# Altium footprint library ICs And Semiconductors THD.PcbLib: 350 footprints (part 14 of 22) (continued)
## LED_MENTOR_RTZ.2081G [mm] "8x Diametre 2mm Green LED Horizontal LED Array" (continued)
  text "C" at -3.279,8.455 h1
  text "A" at 2.763,8.452 h1
  text "1" at -4.227,8.455 h1
  text "2" at -4.227,5.915 h1
  text "3" at -4.227,3.375 h1
  text "4" at -4.227,0.835 h1
  text "5" at -4.227,-1.705 h1
  text "6" at -4.227,-4.245 h1
  text "7" at -4.227,-6.785 h1
  text "8" at -4.227,-9.325 h1
3D body "LED_MENTOR_RTZ.2081G.stp": height 5.08, standoff -3.3, extent -7.37,-10.16 1.93,10.16

## LED_VISHAY_TSAL6200 [mm] "5mm Infrared Emitting Diode, VISHAY TSAL"
height 13.7
pads (2):
  rect 1.3x1.3 hole 0.8: 1(-1.27,0)
  round 1.3 hole 0.8: 2(1.27,0)
Top Overlay:
  lines w0.2: -0.3,-0.6 -0.3,0.6 ; -2.5,-1.47 ccw(c0,0) -2.5,1.47 -2.5,-1.47 ; -0.3,0 0.3,-0.6 0.3,0.6 -0.3,0
Notvisible:
  lines w0.1: -1.27,1 -1.27,0 -0.27,0 ; 0,1 0,0 1,0 ; 1.27,1 1.27,0 2.27,0 ; -1.52,-0.25 -1.52,0.25 -1.02,0.25 -1.02,-0.25 -1.52,-0.25 ; 1.02,-0.25 1.02,0.25 1.52,0.25 1.52,-0.25 1.02,-0.25
  text "C" at -1.651,1 h1
  text "A" at 0.913,1 h1
Mechanical 14:
  circle w0.1: c0,0 r2.5
  lines w0.1: -0.3,-0.6 -0.3,0.6 ; -2.5,-1.47 ccw(c0,0) -2.5,1.47 -2.5,-1.47 ; -0.3,0 0.3,0.6 0.3,-0.6 -0.3,0
3D body "LED_VISHAY_TSAL6200.stp": height 13.7, standoff -3.1, extent -2.5,-2.9 2.9,2.9

## MICROSEMI_D1_FLIP [mm] "MICROSEMI D1 Package Module, Body 94mm x 34mm, Screws on PCB Version"
height 31
pads (3):
  rrect10% 14x17 hole 5.5: 1(23,0) 2(0,0) 3(-23,0)
via -19.103,-2.25 diameter 1 hole 0.5
via -19.103,2.25 diameter 1 hole 0.5
via -26.897,-2.25 diameter 1 hole 0.5
via -23,4.5 diameter 1 hole 0.5
via -26.897,2.25 diameter 1 hole 0.5
via -23,-4.5 diameter 1 hole 0.5
via 3.897,-2.25 diameter 1 hole 0.5
via 3.897,2.25 diameter 1 hole 0.5
via -3.897,-2.25 diameter 1 hole 0.5
via 0,4.5 diameter 1 hole 0.5
via -3.897,2.25 diameter 1 hole 0.5
via 0,-4.5 diameter 1 hole 0.5
via 23,-4.5 diameter 1 hole 0.5
via 19.103,2.25 diameter 1 hole 0.5
via 23,4.5 diameter 1 hole 0.5
via 19.103,-2.25 diameter 1 hole 0.5
via 26.897,2.25 diameter 1 hole 0.5
via 26.897,-2.25 diameter 1 hole 0.5
Top Overlay:
  lines w0.2: -32.8,-16.906 32.8,-16.906 ; -32.8,16.894 32.8,16.894 ; -32,-11.494 -32,-12.506 -30.5,-12.506 ; -32,-10.494 -32,-9.494 ; -32,-8.494 -32,-7.494 ; -32,-6.494 -32,-5.494 ; -32,-4.494 -32,-3.494 ; -32,-2.494 -32,-1.494 ; -32,-0.494 -32,0.506 ; -32,1.506 -32,2.506 ; -32,3.506 -32,4.506 ; -32,5.506 -32,6.506 ; -32,7.506 -32,8.506 ; -32,9.506 -32,10.506 ; -32,11.506 -32,12.494 -30.5,12.494 ; -29.5,-12.506 -28.5,-12.506 ; -29.5,12.494 -28.5,12.494 ; -27.5,-12.506 -26.5,-12.506 ; -27.5,12.494 -26.5,12.494 ; -25.5,-12.506 -24.5,-12.506 ; -25.5,12.494 -24.5,12.494 ; -23.5,-12.506 -22.5,-12.506 ; -23.5,12.494 -22.5,12.494 ; -21.5,-12.506 -20.5,-12.506 ; -21.5,12.494 -20.5,12.494 ; -19.5,-12.506 -18.5,-12.506 ; -19.5,12.494 -18.5,12.494 ; -17.5,-12.506 -16.5,-12.506 ; -17.5,12.494 -16.5,12.494 ; -15.5,-12.506 -14.46,-12.506 -14.46,-11.494 ; -15.5,12.494 -14.46,12.494 -14.46,11.506 ; -14.46,-10.494 -14.46,-9.494 ; -14.46,-8.494 -14.46,-7.494 ; -14.46,-6.494 -14.46,-5.494 ; -14.46,-4.494 -14.46,-3.494 ; -14.46,-2.494 -14.46,-1.494 ; -14.46,-0.494 -14.46,0.506 ; -14.46,1.506 -14.46,2.506 ; -14.46,3.506 -14.46,4.506 ; -14.46,5.506 -14.46,6.506 ; -14.46,7.506 -14.46,8.506 ; -14.46,9.506 -14.46,10.506 ; -9,-11.494 -9,-12.506 -7.5,-12.506 ; -9,-10.494 -9,-9.494 ; -9,-8.494 -9,-7.494 ; -9,-6.494 -9,-5.494 ; -9,-4.494 -9,-3.494 ; -9,-2.494 -9,-1.494 ; -9,-0.494 -9,0.506 ; -9,1.506 -9,2.506 ; -9,3.506 -9,4.506 ; -9,5.506 -9,6.506 ; -9,7.506 -9,8.506 ; -9,9.506 -9,10.506 ; -9,11.506 -9,12.494 -7.5,12.494 ; -6.5,-12.506 -5.5,-12.506 ; -6.5,12.494 -5.5,12.494 ; -4.5,-12.506 -3.5,-12.506 ; -4.5,12.494 -3.5,12.494 ; -2.5,-12.506 -1.5,-12.506 ; -2.5,12.494 -1.5,12.494 ; -0.5,-12.506 0.5,-12.506 ; -0.5,12.494 0.5,12.494 ; 1.5,-12.506 2.5,-12.506 ; 1.5,12.494 2.5,12.494 ; 3.5,-12.506 4.5,-12.506 ; 3.5,12.494 4.5,12.494 ; 5.5,-12.506 6.5,-12.506 ; 5.5,12.494 6.5,12.494 ; 7.5,-12.506 8.54,-12.506 8.54,-11.494 ; 7.5,12.494 8.54,12.494 8.54,11.506 ; 8.54,-10.494 8.54,-9.494 ; 8.54,-8.494 8.54,-7.494 ; 8.54,-6.494 8.54,-5.494 ; 8.54,-4.494 8.54,-3.494 ; 8.54,-2.494 8.54,-1.494 ; 8.54,-0.494 8.54,0.506 ; 8.54,1.506 8.54,2.506 ; 8.54,3.506 8.54,4.506 ; 8.54,5.506 8.54,6.506 ; 8.54,7.506 8.54,8.506 ; 8.54,9.506 8.54,10.506 ; 14,-11.494 14,-12.506 15.5,-12.506 ; 14,-10.494 14,-9.494 ; 14,-8.494 14,-7.494 ; 14,-6.494 14,-5.494 ; 14,-4.494 14,-3.494 ; 14,-2.494 14,-1.494 ; 14,-0.494 14,0.506 ; 14,1.506 14,2.506 ; 14,3.506 14,4.506 ; 14,5.506 14,6.506 ; 14,7.506 14,8.506 ; 14,9.506 14,10.506 ; 14,11.506 14,12.494 15.5,12.494 ; 16.5,-12.506 17.5,-12.506 ; 16.5,12.494 17.5,12.494 ; 18.5,-12.506 19.5,-12.506 ; 18.5,12.494 19.5,12.494 ; 20.5,-12.506 21.5,-12.506 ; 20.5,12.494 21.5,12.494 ; 22.5,-12.506 23.5,-12.506 ; 22.5,12.494 23.5,12.494 ; 24.5,-12.506 25.5,-12.506 ; 24.5,12.494 25.5,12.494 ; 26.5,-12.506 27.5,-12.506 ; 26.5,12.494 27.5,12.494 ; 28.5,-12.506 29.5,-12.506 ; 28.5,12.494 29.5,12.494 ; 30.5,-12.506 31.54,-12.506 31.54,-11.494 ; 30.5,12.494 31.54,12.494 31.54,11.506 ; 31.54,-10.494 31.54,-9.494 ; 31.54,-8.494 31.54,-7.494 ; 31.54,-6.494 31.54,-5.494 ; 31.54,-4.494 31.54,-3.494 ; 31.54,-2.494 31.54,-1.494 ; 31.54,-0.494 31.54,0.506 ; 31.54,1.506 31.54,2.506 ; 31.54,3.506 31.54,4.506 ; 31.54,5.506 31.54,6.506 ; 31.54,7.506 31.54,8.506 ; 31.54,9.506 31.54,10.506
  text "3" at -23.761,9.5 h1.5
  text "2" at -0.647,9.5 h1.5
  text "1" at 22.848,9.5 h1.5
  text "4" at -49.796,-14.541 h1.5
  text "5" at -49.796,-10.037 h1.5
  text "7" at -49.796,7.503 h1.5
  text "6" at -49.796,12.004 h1.5
  text "11" at 48.109,12.512 h1.5
  text "10" at 48.109,8.011 h1.5
  text "8" at 48.206,-10.164 h1.5
  text "9" at 48.206,-14.668 h1.5
Keep-Out Layer:
  board cut-out: -46.8,-16 -46.8,-16.098 -46.762,-16.292 -46.686,-16.474 -46.577,-16.637 -46.437,-16.777 -46.274,-16.886 -46.092,-16.962 -45.899,-17 -45.8,-17 -34.2,-17 -34.102,-17 -33.908,-16.962 -33.726,-16.886 -33.563,-16.777 -33.423,-16.637 -33.314,-16.474 -33.238,-16.292 -33.2,-16.098 -33.2,-16 -33.2,16 -33.2,16.098 -33.238,16.292 -33.314,16.474 -33.423,16.637 -33.563,16.777 -33.726,16.886 -33.908,16.962 -34.102,17 -34.2,17 -45.8,17 -45.899,17 -46.092,16.962 -46.274,16.886 -46.437,16.777 -46.577,16.637 -46.686,16.474 -46.762,16.292 -46.8,16.098 -46.8,16
  board cut-out: 33.2,-16 33.2,-16.098 33.238,-16.292 33.314,-16.474 33.423,-16.637 33.563,-16.777 33.726,-16.886 33.908,-16.962 34.102,-17 34.2,-17 45.8,-17 45.899,-17 46.092,-16.962 46.274,-16.886 46.437,-16.777 46.577,-16.637 46.686,-16.474 46.762,-16.292 46.8,-16.098 46.8,-16 46.8,16 46.8,16.098 46.762,16.292 46.686,16.474 46.577,16.637 46.437,16.777 46.274,16.886 46.092,16.962 45.899,17 45.8,17 34.2,17 34.102,17 33.908,16.962 33.726,16.886 33.563,16.777 33.423,16.637 33.314,16.474 33.238,16.292 33.2,16.098 33.2,16
Mechanical 1:
  lines w1.27: -46.8,-16 ccw(c-45.8,-16) -45.8,-17 -34.2,-17 ccw(c-34.2,-16) -33.2,-16 -33.2,16 ccw(c-34.2,16) -34.2,17 -45.8,17 ccw(c-45.8,16) -46.8,16 -46.8,-16 ; 33.2,-16 ccw(c34.2,-16) 34.2,-17 45.8,-17 ccw(c45.8,-16) 46.8,-16 46.8,16 ccw(c45.8,16) 45.8,17 34.2,17 ccw(c34.2,16) 33.2,16 33.2,-16
Notvisible:
  drawing of 321 lines, arcs and shapes, not listed
Mechanical 14:
  drawing of 262 lines, arcs and shapes, not listed
  text "3" at -23.761,9.5 h1.5
  text "2" at -0.647,9.5 h1.5
  text "1" at 22.848,9.5 h1.5
  text "4" at -49.796,-14.541 h1.5
  text "5" at -49.796,-10.037 h1.5
  text "7" at -49.796,7.503 h1.5
  text "6" at -49.796,12.004 h1.5
  text "11" at 48.109,12.512 h1.5
  text "10" at 48.109,8.011 h1.5
  text "8" at 48.206,-10.164 h1.5
  text "9" at 48.206,-14.668 h1.5
Drill Drawing:
  lines w0.1: -46.2,5.878 -46.8,6.096 ; -46.2,6.314 -46.8,6.096 ; -43.652,-16.4 -43.434,-17 ; -43.652,16.4 -43.434,17 ; -43.216,-16.4 -43.434,-17 ; -43.216,16.4 -43.434,17 ; -40.5,0 -40,0 ; -40,-0.5 -40,0 ; -40,0.5 -40,0 ; -39.5,0 -40,0 ; -39.37,-15.886 -34.152,-15.886 -33.401,-16.637 ; -34.307,-16.214 -33.401,-16.637 ; -33.824,-15.731 -33.401,-16.637 ; -33.8,5.878 -33.2,6.096 ; -33.8,6.314 -33.2,6.096 ; 33.8,5.878 33.2,6.096 ; 33.8,6.314 33.2,6.096 ; 36.348,-16.4 36.566,-17 ; 36.348,16.4 36.566,17 ; 36.784,-16.4 36.566,-17 ; 36.784,16.4 36.566,17 ; 39.5,0 40,0 ; 40,-0.5 40,0 ; 40,0.5 40,0 ; 40.5,0 40,0 ; 40.63,-15.886 45.848,-15.886 46.599,-16.637 ; 45.693,-16.214 46.599,-16.637 ; 46.176,-15.731 46.599,-16.637 ; 46.2,5.878 46.8,6.096 ; 46.2,6.314 46.8,6.096 ; -46.8,6.096 -33.2,6.096 ; -43.434,-17 -43.434,17 ; 33.2,-16 ccw(c34.2,-16) 34.2,-17 ; 33.2,-16 ccw(c34.2,-16) 34.2,-17 ; 33.2,-16 33.2,16 ; 33.2,-16 33.2,16 ; 33.2,6.096 46.8,6.096 ; 33.2,16 cw(c34.2,16) 34.2,17 ; 33.2,16 cw(c34.2,16) 34.2,17 ; 34.2,-17 45.8,-17 ; 34.2,-17 45.8,-17 ; 34.2,17 45.8,17 ; 34.2,17 45.8,17 ; 36.566,-17 36.566,17 ; 45.8,-17 ccw(c45.8,-16) 46.8,-16 ; 45.8,-17 ccw(c45.8,-16) 46.8,-16 ; 45.8,17 cw(c45.8,16) 46.8,16 ; 45.8,17 cw(c45.8,16) 46.8,16 ; 46.8,-16 46.8,16 ; 46.8,-16 46.8,16 ; -46.8,-16 ccw(c-45.8,-16) -45.8,-17 -34.2,-17 ccw(c-34.2,-16) -33.2,-16 -33.2,16 ccw(c-34.2,16) -34.2,17 -45.8,17 ccw(c-45.8,16) -46.8,16 -46.8,-16
  text "34mm" at 36.058,-0.635 h0.9
  text "13.6mm" at 40.757,6.604 h0.9
  text "r =1mm" at 40.757,-15.621 h0.9
  text "r =1mm" at -39.243,-15.621 h0.9
  text "13.6mm" at -39.243,6.604 h0.9
  text "34mm" at -43.942,-0.635 h0.9
3D body "MICROSEMI_D1_FLIP_Part1.stp": height 30.51, standoff 0, extent -47,-16.906 47,16.894
3D body "MICROSEMI_D1_FLIP_Part2.stp": height 10.4, standoff -5.27, extent -27.75,-4.75 27.75,4.75

## MICROSEMI_SOT-227_FLIP [mm] "MICROSEMI SOT-227 (ISOTOP) Case, Body 38.2mm x 25.4mm, Screws on PCB Version"
height 12.2
pads (4):
  rrect50% 9.5x9.5 hole 4.4: 1(7.5,6.35) 2(-7.5,6.35) 3(-7.5,-6.35) 4(7.5,-6.35)
via -4.75,-4.763 diameter 1 hole 0.5
via -7.5,-3.175 diameter 1 hole 0.5
via -10.25,-4.763 diameter 1 hole 0.5
via -10.25,-7.938 diameter 1 hole 0.5
via -7.5,-9.525 diameter 1 hole 0.5
via -4.75,-7.938 diameter 1 hole 0.5
via 10.25,-4.763 diameter 1 hole 0.5
via 7.5,-3.175 diameter 1 hole 0.5
via 4.75,-4.763 diameter 1 hole 0.5
via 4.75,-7.938 diameter 1 hole 0.5
via 7.5,-9.525 diameter 1 hole 0.5
via 10.25,-7.938 diameter 1 hole 0.5
via -4.75,7.938 diameter 1 hole 0.5
via -7.5,9.525 diameter 1 hole 0.5
via -10.25,7.938 diameter 1 hole 0.5
via -10.25,4.763 diameter 1 hole 0.5
via -7.5,3.175 diameter 1 hole 0.5
via -4.75,4.763 diameter 1 hole 0.5
via 10.25,7.938 diameter 1 hole 0.5
via 7.5,9.525 diameter 1 hole 0.5
via 4.75,7.938 diameter 1 hole 0.5
via 4.75,4.763 diameter 1 hole 0.5
via 7.5,3.175 diameter 1 hole 0.5
via 10.25,4.763 diameter 1 hole 0.5
Top Overlay:
  circle w0.2: c-15.1,0 r2.15
  lines w0.2: -15.85,-11.521 -15.85,-12.479 ; -15.85,-10.521 -15.85,-9.521 ; -15.85,9.479 -15.85,10.479 ; -15.85,11.479 -15.85,12.479 ; -15.628,-8.521 -15.043,-7.521 ; -15.603,8.479 -15.018,7.479 ; -14.457,-6.521 -13.871,-5.521 ; -14.432,6.479 -13.847,5.479 ; -13.286,-4.521 -12.7,-3.521 ; -13.261,4.479 -12.676,3.479 ; -12.115,-2.521 -11.778,-1.945 ccw(c-15.1,0) -11.563,-1.521 ; -12.09,2.479 -11.778,1.945 cw(c-15.1,0) -11.545,1.479 ; -11.285,-0.521 ccw(c-15.1,0) -11.28,0.479 ; 11.28,0.479 ccw(c15.1,0) 11.285,-0.521 ; 11.545,1.479 cw(c15.1,0) 11.778,1.945 12.09,2.479 ; 11.563,-1.521 ccw(c15.1,0) 11.778,-1.945 12.115,-2.521 ; 12.676,3.479 13.261,4.479 ; 12.7,-3.521 13.286,-4.521 ; 13.847,5.479 14.432,6.479 ; 13.871,-5.521 14.457,-6.521 ; 15.018,7.479 15.603,8.479 ; 15.043,-7.521 15.628,-8.521 ; 15.85,-11.521 15.85,-12.479 ; 15.85,-10.521 15.85,-9.521 ; 15.85,9.479 15.85,10.479 ; 15.85,11.479 15.85,12.479 ; -15.85,-12.479 -17.5,-12.479 -19.1,-10.879 -19.1,10.879 -17.5,12.479 -15.85,12.479 ; -15.85,-12.479 15.85,-12.479 ; -15.85,12.479 15.85,12.479 ; 15.1,-2.15 cw(c15.1,0) 15.1,2.15 ; 15.1,-2.15 19.1,-2.15 ; 15.1,-2.15 19.1,-2.15 ; 15.1,2.15 19.1,2.15 ; 15.1,2.15 19.1,2.15 ; 15.85,-12.479 17.5,-12.479 19.1,-10.879 19.1,-2.15 ; 15.85,12.479 17.5,12.479 19.1,10.879 19.1,2.15
Notvisible:
  lines w0.1: -15.1,0 -16.1,0 -15.1,0 ; -15.1,0 -14.1,0 -15.1,0 ; -15.1,0 -15.1,1 -15.1,0 ; -15.1,0 -15.1,-1 -15.1,0 ; -7.5,-6.35 -8.5,-6.35 -7.5,-6.35 ; -7.5,-6.35 -6.5,-6.35 -7.5,-6.35 ; -7.5,-6.35 -7.5,-5.35 -7.5,-6.35 ; -7.5,-6.35 -7.5,-7.35 -7.5,-6.35 ; -7.5,6.35 -8.5,6.35 -7.5,6.35 ; -7.5,6.35 -6.5,6.35 -7.5,6.35 ; -7.5,6.35 -7.5,7.35 -7.5,6.35 ; -7.5,6.35 -7.5,5.35 -7.5,6.35 ; 0,0 -1,0 0,0 ; 0,0 1,0 0,0 ; 0,0 0,1 0,0 ; 0,0 0,-1 0,0 ; 7.5,-6.35 6.5,-6.35 7.5,-6.35 ; 7.5,-6.35 8.5,-6.35 7.5,-6.35 ; 7.5,-6.35 7.5,-5.35 7.5,-6.35 ; 7.5,-6.35 7.5,-7.35 7.5,-6.35 ; 7.5,6.35 6.5,6.35 7.5,6.35 ; 7.5,6.35 8.5,6.35 7.5,6.35 ; 7.5,6.35 7.5,7.35 7.5,6.35 ; 7.5,6.35 7.5,5.35 7.5,6.35 ; 15.1,0 14.1,0 15.1,0 ; 15.1,0 16.1,0 15.1,0 ; 15.1,0 15.1,1 15.1,0 ; 15.1,0 15.1,-1 15.1,0
Mechanical 14:
  circle w0.1: c-15.1,0 r2.15
  circle w0.1: c-7.5,-6.35 r2.2
  circle w0.1: c7.5,-6.35 r2.2
  circle w0.1: c7.5,6.35 r2.2
  circle w0.1: c-7.5,6.35 r2.2
  lines w0.1: -15.85,-11.521 -15.85,-12.479 ; -15.85,-10.521 -15.85,-9.521 ; -15.85,9.479 -15.85,10.479 ; -15.85,11.479 -15.85,12.479 ; -15.628,-8.521 -15.043,-7.521 ; -15.603,8.479 -15.018,7.479 ; -14.457,-6.521 -13.871,-5.521 ; -14.432,6.479 -13.847,5.479 ; -13.286,-4.521 -12.7,-3.521 ; -13.261,4.479 -12.676,3.479 ; -12.115,-2.521 -11.778,-1.945 ccw(c-15.1,0) -11.563,-1.521 ; -12.09,2.479 -11.778,1.945 cw(c-15.1,0) -11.545,1.479 ; -11.5,-10.521 -11.5,-11.314 -11.1,-11.314 ; -11.5,-9.521 -11.5,-8.521 ; -11.5,-7.521 -11.5,-6.521 ; -11.5,-5.521 -11.5,-4.521 ; -11.5,-3.521 -11.5,-3.342 ; -11.5,3.479 -11.5,3.342 -10.637,2.479 ; -11.5,4.479 -11.5,5.479 ; -11.5,6.479 -11.5,7.479 ; -11.5,8.479 -11.5,9.479 ; -11.5,10.479 -11.5,11.314 -11.1,11.314 ; -11.285,-0.521 ccw(c-15.1,0) -11.28,0.479 ; -10.1,-11.314 -9.1,-11.314 ; -10.1,11.314 -9.1,11.314 ; -10,1.842 -9.1,1.842 ; -8.1,-11.314 -7.1,-11.314 ; -8.1,1.842 -7.1,1.842 ; -8.1,11.314 -7.1,11.314 ; -6.1,-11.314 -5.1,-11.314 ; -6.1,1.842 -5.1,1.842 ; -6.1,11.314 -5.1,11.314 ; -5.1,-1.842 -6.1,-1.842 -5,-1.842 ; -4.363,2.479 -3.5,3.342 -3.5,3.479 ; -4.1,-11.314 -3.5,-11.314 -3.5,-10.521 ; -4.1,11.314 -3.5,11.314 -3.5,10.479 ; -3.5,-9.521 -3.5,-8.521 ; -3.5,-7.521 -3.5,-6.521 ; -3.5,-5.521 -3.5,-4.521 ; -3.5,-3.521 -3.5,-3.342 ; -3.5,4.479 -3.5,5.479 ; -3.5,6.479 -3.5,7.479 ; -3.5,8.479 -3.5,9.479 ; 3.5,-10.521 3.5,-11.314 3.9,-11.314 ; 3.5,-9.521 3.5,-8.521 ; 3.5,-7.521 3.5,-6.521 ; 3.5,-5.521 3.5,-4.521 ; 3.5,-3.521 3.5,-3.342 4.321,-2.521 ; 3.5,3.479 3.5,3.342 4.363,2.479 ; 3.5,4.479 3.5,5.479 ; 3.5,6.479 3.5,7.479 ; 3.5,8.479 3.5,9.479 ; 3.5,10.479 3.5,11.314 3.9,11.314 ; 4.9,-11.314 5.9,-11.314 ; 4.9,11.314 5.9,11.314 ; 5,-1.842 5.9,-1.842 ; 5,1.842 5.9,1.842 ; 6.9,-11.314 7.9,-11.314 ; 6.9,-1.842 7.9,-1.842 ; 6.9,1.842 7.9,1.842 ; 6.9,11.314 7.9,11.314 ; 8.9,-11.314 9.9,-11.314 ; 8.9,-1.842 9.9,-1.842 ; 8.9,1.842 9.9,1.842 ; 8.9,11.314 9.9,11.314 ; 10.637,2.479 11.5,3.342 11.5,3.479 ; 10.679,-2.521 11.5,-3.342 11.5,-3.521 ; 10.9,-11.314 11.5,-11.314 11.5,-10.521 ; 10.9,11.314 11.5,11.314 11.5,10.479 ; 11.28,0.479 ccw(c15.1,0) 11.285,-0.521 ; 11.5,-9.521 11.5,-8.521 ; 11.5,-7.521 11.5,-6.521 ; 11.5,-5.521 11.5,-4.521 ; 11.5,4.479 11.5,5.479 ; 11.5,6.479 11.5,7.479 ; 11.5,8.479 11.5,9.479 ; 11.545,1.479 cw(c15.1,0) 11.778,1.945 12.09,2.479 ; 11.563,-1.521 ccw(c15.1,0) 11.778,-1.945 12.115,-2.521 ; 12.676,3.479 13.261,4.479 ; 12.7,-3.521 13.286,-4.521 ; 13.847,5.479 14.432,6.479 ; 13.871,-5.521 14.457,-6.521 ; 15.018,7.479 15.603,8.479 ; 15.043,-7.521 15.628,-8.521 ; 15.85,-11.521 15.85,-12.479 ; 15.85,-10.521 15.85,-9.521 ; 15.85,9.479 15.85,10.479 ; 15.85,11.479 15.85,12.479 ; -15.85,-12.479 15.85,-12.479 ; -15.85,-12.479 -17.5,-12.479 -19.1,-10.879 -19.1,10.879 -17.5,12.479 -15.85,12.479 ; -15.85,12.479 15.85,12.479 ; -11.5,-3.342 -10.679,-2.521 -11.5,-3.342 ; -3.5,-3.342 -4.321,-2.521 -3.5,-3.342 ; 15.1,-2.15 cw(c15.1,0) 15.1,2.15 ; 15.1,-2.15 19.1,-2.15 ; 15.1,-2.15 19.1,-2.15 ; 15.1,2.15 19.1,2.15 ; 15.1,2.15 19.1,2.15 ; 15.85,-12.479 17.5,-12.479 19.1,-10.879 19.1,-2.15 ; 15.85,12.479 17.5,12.479 19.1,10.879 19.1,2.15 ; -10,-1.842 -9.1,-1.842 -10,-1.842 ; -8.1,-1.842 -7.1,-1.842 -8.1,-1.842
3D body "MICROSEMI_ISOTOP_FLIP_Part1.stp": height 12.04, standoff 0, extent -19.1,-12.479 19.1,12.479
3D body "MICROSEMI_ISOTOP_FLIP_Part2.stp": height 10.24, standoff -4.69, extent -11.5,-10.365 11.5,10.365

## MQ-3_B [mm] "6 Leads Alcohol Sensor, Body Dia. 16.8mm, Body Height 10mm, Lead Spacing Diameter 9.5mm"
height 10
pads (6):
  round 2 hole 1.3: A1(-3.359,3.359) A2(3.359,3.359) B1(-3.359,-3.359) B2(3.359,-3.359) H1(0,4.75) H2(0,-4.75)
Top Overlay:
  circle w0.2: c0,0 r8.65
Notvisible:
  lines w0.1: -3.712,-3.712 -3.359,-3.359 ; -3.712,-3.005 -3.359,-3.359 ; -3.712,3.005 -3.359,3.359 ; -3.712,3.712 -3.359,3.359 ; -3.005,-3.712 -3.359,-3.359 ; -3.005,-3.005 -3.359,-3.359 ; -3.005,3.005 -3.359,3.359 ; -3.005,3.712 -3.359,3.359 ; -0.5,-4.75 0,-4.75 ; -0.5,0 0,0 ; -0.5,4.75 0,4.75 ; 0,-5.25 0,-4.75 ; 0,-4.25 0,-4.75 ; 0,-0.5 0,0 ; 0,0.5 0,0 ; 0,4.25 0,4.75 ; 0,5.25 0,4.75 ; 0.5,-4.75 0,-4.75 ; 0.5,0 0,0 ; 0.5,4.75 0,4.75 ; 3.005,-3.712 3.359,-3.359 ; 3.005,-3.005 3.359,-3.359 ; 3.005,3.005 3.359,3.359 ; 3.005,3.712 3.359,3.359 ; 3.712,-3.712 3.359,-3.359 ; 3.712,-3.005 3.359,-3.359 ; 3.712,3.005 3.359,3.359 ; 3.712,3.712 3.359,3.359
Mechanical 14:
  circle w0.1: c0,0 r8.65
  circle w0.1: c0,0 r5
3D body "MQ-3_B.stp": height 10, standoff -3.6, extent -8.65,-8.633 8.65,8.633

## NTE_TO-3PML_v [mm] "NTE TO-3PML 3-Terminal - Vertical Mount"
height 26
pads (3):
  rect 2.1x2.1 hole 1.4: 1(-5.45,0)
  round 2.1 hole 1.4: 2(0,0) 3(5.45,0)
Top Overlay:
  lines w0.2: -8,1.8 0,1.8 8,1.8 ; -8,1.8 -7.568,-1.8 0,-1.8 7.568,-1.8 8,1.8 ; -8,1.8 -7.76,3.8 0,3.8 7.76,3.8 8,1.8
Notvisible:
  lines w0.1: -5.95,0 -5.45,0 ; -5.45,-0.5 -5.45,0 ; -5.45,0.5 -5.45,0 ; -4.95,0 -5.45,0 ; -0.5,0 0,0 ; 0,-0.5 0,0 ; 0,0.5 0,0 ; 0.5,0 0,0 ; 4.95,0 5.45,0 ; 5.45,-0.5 5.45,0 ; 5.45,0.5 5.45,0 ; 5.95,0 5.45,0
Mechanical 14:
  lines w0.1: -8,1.8 0,1.8 8,1.8 ; -8,1.8 -7.568,-1.8 0,-1.8 7.568,-1.8 8,1.8 ; -8,1.8 -7.76,3.8 0,3.8 7.76,3.8 8,1.8
3D body "NTE_TO-3PML.stp": height 28, standoff -4, extent -8,-1.8 8,3.8

## ONSEMI_CASE 017AA-01 [mm] "ONSEMICONDUCTOR CASE 017AA-01, Diode, Axial; Lead Spacing 15.24mm, Lead Dia. 1.09mm, Body Length 8.89mm, Body Dia. 3.68mm"
height 3.68
pads (2):
  round 2.1 hole 1.4: 1(-7.62,0) 2(7.62,0)
Top Overlay:
  lines w0.2: -6.33,-0.545 -4.445,-0.545 ; -6.33,0.545 -4.445,0.545 ; -2.945,-1.84 -2.945,1.84 ; -2.77,-1.84 -2.77,1.84 ; -2.62,-1.84 -2.62,1.84 ; -2.495,-1.84 -2.495,1.84 ; -2.295,-1.84 -2.295,1.84 ; -2.12,-1.84 -2.12,1.84 ; -1.945,-1.84 -1.945,1.84 ; 4.445,-0.545 6.33,-0.545 ; 4.445,0.545 6.33,0.545 ; -4.445,-1.84 4.445,-1.84 4.445,1.84 -4.445,1.84 -4.445,-1.84
Notvisible:
  lines w0.1: -8.12,0 -7.62,0 ; -7.62,-0.5 -7.62,0 ; -7.62,0.5 -7.62,0 ; -7.12,0 -7.62,0 ; -0.5,0 0,0 ; 0,-0.5 0,0 ; 0,0.5 0,0 ; 0.5,0 0,0 ; 7.12,0 7.62,0 ; 7.62,-0.5 7.62,0 ; 7.62,0.5 7.62,0 ; 8.12,0 7.62,0
Mechanical 14:
  lines w0.1: -4.445,-0.545 -7.62,-0.545 cw(c-7.62,0) -7.62,0.545 -4.445,0.545 ; -2.945,-1.84 -2.945,1.84 ; -2.845,-1.84 -2.845,1.84 ; -2.77,-1.84 -2.77,1.84 ; -2.695,-1.84 -2.695,1.84 ; -2.62,-1.84 -2.62,1.84 ; -2.545,-1.84 -2.545,1.84 ; -2.47,-1.84 -2.47,1.84 ; -2.37,-1.84 -2.37,1.84 ; -2.295,-1.84 -2.295,1.84 ; -2.195,-1.84 -2.195,1.84 ; -2.12,-1.84 -2.12,1.84 ; -2.045,-1.84 -2.045,1.84 ; -1.945,-1.84 -1.945,1.84 ; 4.445,-0.545 7.62,-0.545 ccw(c7.62,0) 7.62,0.545 4.445,0.545 ; -4.445,-1.84 4.445,-1.84 4.445,1.84 -4.445,1.84 -4.445,-1.84
3D body "ON SEMI_CASE 017AA-01.stp": height 3.68, standoff -3.6, extent -8.165,-1.84 8.165,1.84

## ONSEMI_CASE 41A-04 [mm] "ONSEMICONDUCTOR CASE 41A-04, Diode, Axial; Lead Spacing 15.24mm, Lead Dia. 1.06mm, Body Length 9mm, Body Dia. 5.05mm"
height 3.68
pads (2):
  round 2 hole 1.3: 1(-8.89,0) 2(8.89,0)
Top Overlay:
  lines w0.2: -7.487,-0.53 -4.75,-0.53 ; -7.487,0.53 -4.75,0.53 ; -3.75,-2.65 -3.75,2.65 ; -3.55,-2.65 -3.55,2.65 ; -3.35,-2.65 -3.35,2.65 ; -3.15,-2.65 -3.15,2.65 ; -2.95,-2.65 -2.95,2.65 ; -2.75,-2.65 -2.75,2.65 ; 4.75,-0.53 7.487,-0.53 ; 4.75,0.53 7.487,0.53 ; -4.75,-2.65 -4.75,2.65 4.75,2.65 4.75,-2.65 -4.75,-2.65
Notvisible:
  lines w0.1: -9.39,0 -8.89,0 ; -8.89,-0.5 -8.89,0 ; -8.89,0.5 -8.89,0 ; -8.39,0 -8.89,0 ; -0.5,0 0,0 ; 0,-0.5 0,0 ; 0,0.5 0,0 ; 0.5,0 0,0 ; 8.39,0 8.89,0 ; 8.89,-0.5 8.89,0 ; 8.89,0.5 8.89,0 ; 9.39,0 8.89,0
Mechanical 14:
  lines w0.1: -4.75,-0.53 -8.89,-0.53 cw(c-8.89,0) -8.89,0.53 -4.75,0.53 ; -3.75,-2.65 -3.75,2.65 ; -3.55,-2.65 -3.55,2.65 ; -3.35,-2.65 -3.35,2.65 ; -3.15,-2.65 -3.15,2.65 ; -2.95,-2.65 -2.95,2.65 ; -2.75,-2.65 -2.75,2.65 ; 4.75,-0.53 8.89,-0.53 ccw(c8.89,0) 8.89,0.53 4.75,0.53 ; -4.75,-2.65 -4.75,2.65 4.75,2.65 4.75,-2.65 -4.75,-2.65
3D body "ONSEMI_CASE 41A-04.stp": height 5.3, standoff -3.8, extent -9.42,-2.65 9.42,2.65

## OSC_ABRACON_ACH [mm] "Oscillator DIP8, 4 Leads, Pitch 7.62 mm X 7.62mm; Body 12.7mm X 12.7mm"
height 6.39
pads (4):
  rect 1.3x1.3 hole 0.8: 1(-3.81,3.81)
  round 1.3 hole 0.8: 4(-3.81,-3.81) 5(3.81,-3.81) 8(3.81,3.81)
Top Overlay:
  circle w0.25: c-5.081,5.101 r0.125
  lines w0.2: -6.35,-5.08 ccw(c-5.08,-5.08) -5.08,-6.35 5.08,-6.35 ccw(c5.08,-5.08) 6.35,-5.08 6.35,5.08 ccw(c5.08,5.08) 5.08,6.35 -6.35,6.35 -6.35,-5.08 ; -5.715,-5.08 ccw(c-5.08,-5.08) -5.08,-5.715 5.08,-5.715 ccw(c5.08,-5.08) 5.715,-5.08 5.715,5.08 ccw(c5.08,5.08) 5.08,5.715 -5.08,5.715 ccw(c-5.08,5.08) -5.715,5.08 -5.715,-5.08
Mechanical 14:
  circle w0.1: c-4.445,4.445 r0.5
  lines w0.1: -6.35,-5.08 ccw(c-5.08,-5.08) -5.08,-6.35 5.08,-6.35 ccw(c5.08,-5.08) 6.35,-5.08 6.35,5.08 ccw(c5.08,5.08) 5.08,6.35 -6.35,6.35 -6.35,-5.08 ; -5.715,-5.08 ccw(c-5.08,-5.08) -5.08,-5.715 5.08,-5.715 ccw(c5.08,-5.08) 5.715,-5.08 5.715,5.08 ccw(c5.08,5.08) 5.08,5.715 -5.08,5.715 ccw(c-5.08,5.08) -5.715,5.08 -5.715,-5.08
3D body "OSC_ABRACON_ACH.stp": height 6.39, standoff -3.6, extent -6.35,-6.35 6.35,6.35